# Altium footprint library Supernova Connectors.PcbLib: 303 footprints (part 2 of 19)
Each footprint in its own frame and in the unit in brackets; x right, y up, seen from the top. Pads: shape width x height; smd on the part's side, far side on the other; paste and mask are expansions set on the pad; w line width, h text height; cw(c..) or ccw(c..) is an arc to the next point about the centre after c.
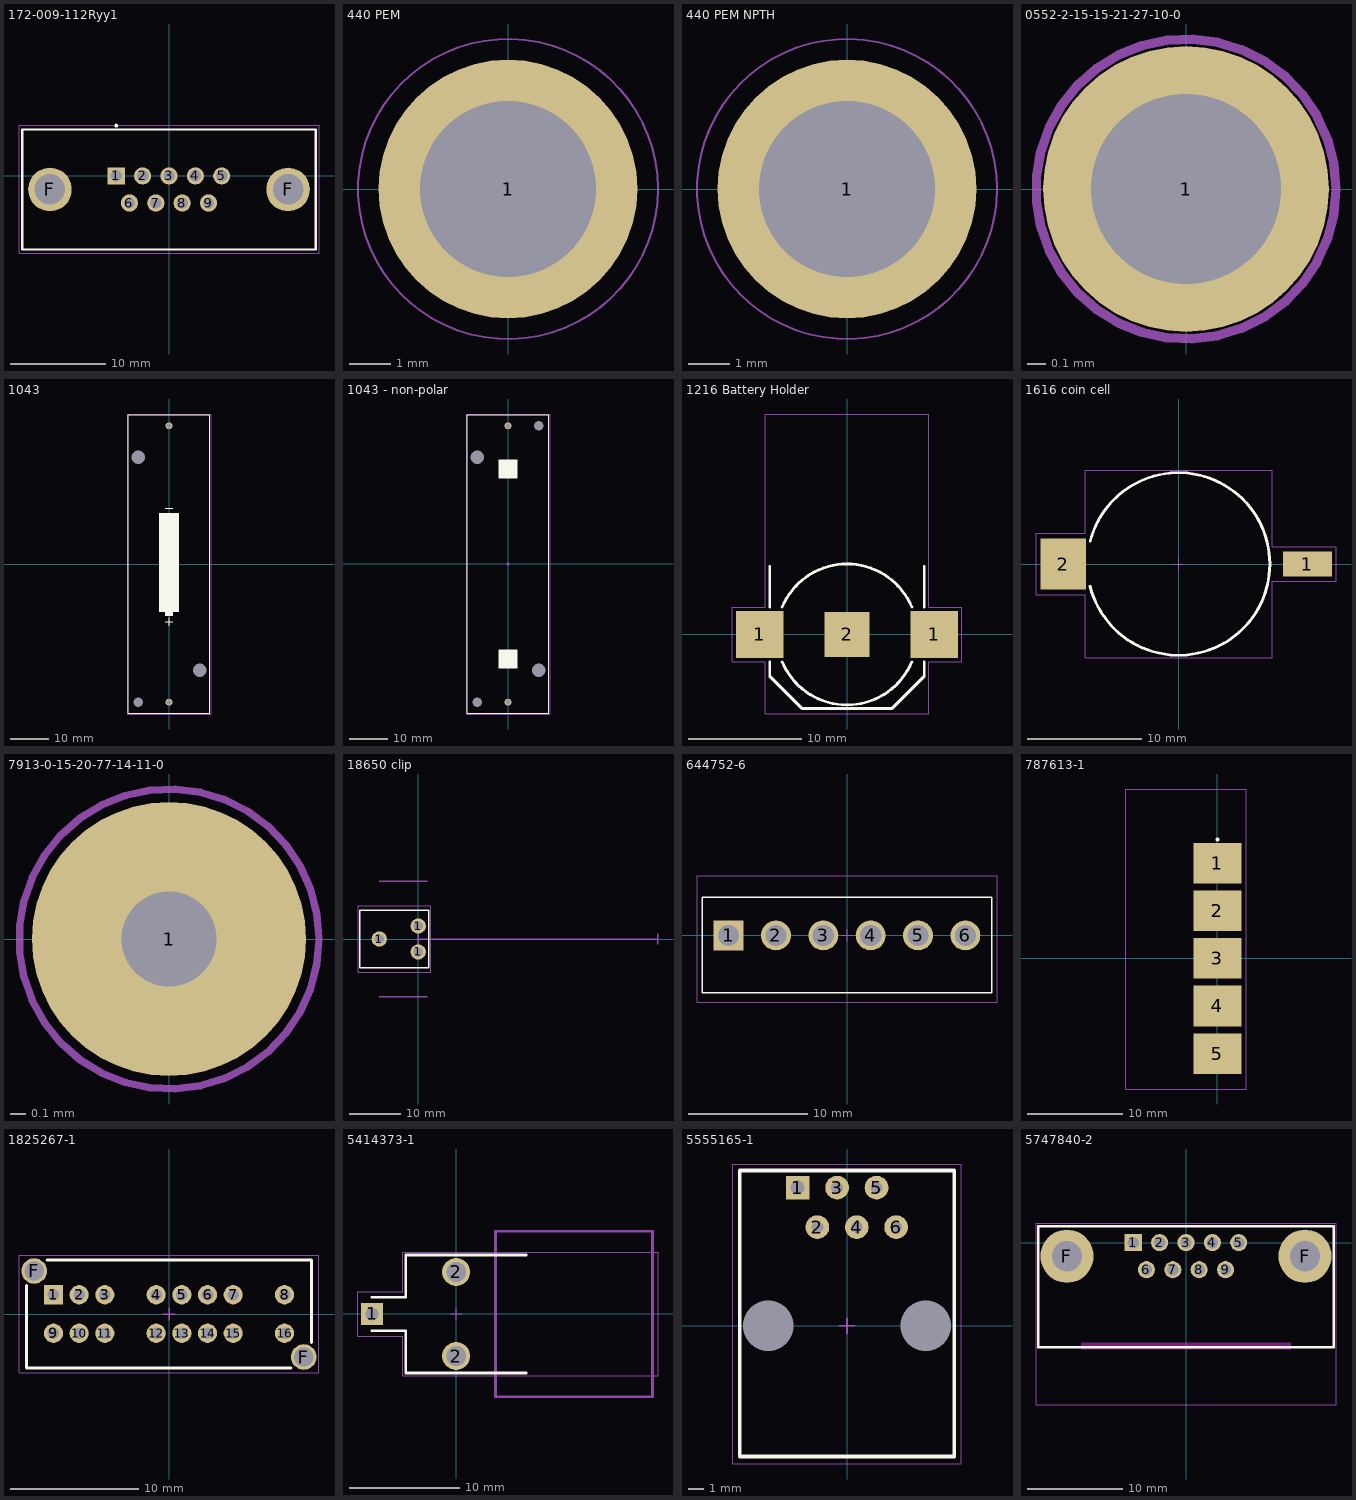
[diagram p1: the footprints below, top view; thin cyan lines are the x and y axes]

## 172-009-112Ryy1 [mil]
pads (11):
  rect 70.87x70.87 hole 47: 1(-218,0)
  round 70.87 hole 47: 2(-109,0) 3(0,0) 4(109,0) 5(218,0) 6(-163.5,-112) 7(-54.5,-112) 8(54.5,-112) 9(163.5,-112)
  round 180 hole 126: F(-492,-56) F(492,-56)
Top Overlay:
  circle w8: c-218,207.8 r4
  lines w10: -606.29,-304.13 606.7,-304.13 606.7,191.87 -606.29,191.87 -606.29,-304.13
Top Courtyard:
  lines w1.97: -620,-320 620,-320 620,210 -620,210 -620,-320
  lines w3.94: -19.68,0 19.68,0 ; 0,-19.69 0,19.68
3D body "172-009-112.STEP": height 494, standoff -189.5, extent -606.29,-304.13 606.7,191.87

## 440 PEM [mil]
pads (1):
  round 244 hole 166: 1(0,0)
Top Paste:
  region: 11.81,-113.56 21.51,-112.55 40.29,-107.27 57.9,-98.88 73.83,-87.63 87.63,-73.83 98.88,-57.9 107.27,-40.29 112.55,-21.51 113.56,-11.81 89,-11.81 89.21,-11.84 87.95,-19.08 83.68,-33.13 77.17,-46.3 68.62,-58.23 58.23,-68.62 46.3,-77.18 33.13,-83.68 19.08,-87.95 11.84,-89.22 11.81,-89
  region: 113.56,11.81 112.55,21.51 107.27,40.29 98.88,57.9 87.63,73.83 73.83,87.63 57.9,98.88 40.29,107.27 21.51,112.55 11.81,113.56 11.81,89 11.84,89.21 19.08,87.95 33.13,83.68 46.3,77.17 58.23,68.62 68.62,58.23 77.18,46.3 83.68,33.13 87.95,19.08 89.22,11.84 89,11.81
  region: -11.81,113.56 -21.51,112.55 -40.29,107.27 -57.9,98.88 -73.83,87.63 -87.63,73.83 -98.88,57.9 -107.27,40.29 -112.55,21.51 -113.56,11.81 -89,11.81 -89.21,11.84 -87.95,19.08 -83.68,33.13 -77.17,46.3 -68.62,58.23 -58.23,68.62 -46.3,77.18 -33.13,83.68 -19.08,87.95 -11.84,89.22 -11.81,89
  region: -113.56,-11.81 -112.55,-21.51 -107.27,-40.29 -98.88,-57.9 -87.63,-73.83 -73.83,-87.63 -57.9,-98.88 -40.29,-107.27 -21.51,-112.55 -11.81,-113.56 -11.81,-89 -11.84,-89.21 -19.08,-87.95 -33.13,-83.68 -46.3,-77.17 -58.23,-68.62 -68.62,-58.23 -77.18,-46.3 -83.68,-33.13 -87.95,-19.08 -89.22,-11.84 -89,-11.81
Top Courtyard:
  circle w1.97: c0,0 r141.42
  lines w3.94: -19.68,0 19.68,0 ; 0,-19.69 0,19.68
3D body "PEM.STEP": height 125, standoff -60, extent -109.49,-109.49 109.51,109.51

## 440 PEM NPTH [mil]
pads (1):
  round 244 / inner oval 78.74x244.02 / far side round 78.74 hole 166 unplated: 1(0,0)
Top Paste:
  region: 11.81,-113.56 21.51,-112.55 40.29,-107.27 57.9,-98.88 73.83,-87.63 87.63,-73.83 98.88,-57.9 107.27,-40.29 112.55,-21.51 113.56,-11.81 89,-11.81 89.21,-11.84 87.95,-19.08 83.68,-33.13 77.17,-46.3 68.62,-58.23 58.23,-68.62 46.3,-77.18 33.13,-83.68 19.08,-87.95 11.84,-89.22 11.81,-89
  region: 113.56,11.81 112.55,21.51 107.27,40.29 98.88,57.9 87.63,73.83 73.83,87.63 57.9,98.88 40.29,107.27 21.51,112.55 11.81,113.56 11.81,89 11.84,89.21 19.08,87.95 33.13,83.68 46.3,77.17 58.23,68.62 68.62,58.23 77.18,46.3 83.68,33.13 87.95,19.08 89.22,11.84 89,11.81
  region: -11.81,113.56 -21.51,112.55 -40.29,107.27 -57.9,98.88 -73.83,87.63 -87.63,73.83 -98.88,57.9 -107.27,40.29 -112.55,21.51 -113.56,11.81 -89,11.81 -89.21,11.84 -87.95,19.08 -83.68,33.13 -77.17,46.3 -68.62,58.23 -58.23,68.62 -46.3,77.18 -33.13,83.68 -19.08,87.95 -11.84,89.22 -11.81,89
  region: -113.56,-11.81 -112.55,-21.51 -107.27,-40.29 -98.88,-57.9 -87.63,-73.83 -73.83,-87.63 -57.9,-98.88 -40.29,-107.27 -21.51,-112.55 -11.81,-113.56 -11.81,-89 -11.84,-89.21 -19.08,-87.95 -33.13,-83.68 -46.3,-77.17 -58.23,-68.62 -68.62,-58.23 -77.18,-46.3 -83.68,-33.13 -87.95,-19.08 -89.22,-11.84 -89,-11.81
Top Courtyard:
  circle w1.97: c0,0 r141.42
  lines w3.94: -19.68,0 19.68,0 ; 0,-19.69 0,19.68
3D body "PEM.STEP": height 125, standoff -60, extent -109.49,-109.49 109.51,109.51

## 0552-2-15-15-21-27-10-0 [mil] "Pin socket"
pads (1):
  round 60 hole 40: 1(0,0)
Top Courtyard:
  circle w1.97: c0,0 r31.5
  lines w3.94: -19.68,0 19.68,0 ; 0,-19.69 0,19.68
3D body "mill-max-0552-2-15-15-21-XX-10-0.step": height 18, standoff -152, extent -27.49,-27.49 27.51,27.51

## 1043 [mil]
pads (5):
  round 70 hole 52: 1(0,-1411) 2(0,1411)
  round 39.37 hole 94 unplated: NC(-315,-1411)
  round 39.37 hole 136 unplated: NC(-315,1090) NC(315,-1085)
Top Overlay:
  rectangle: -40,-531 40,-491
  rectangle: -100,-491 100,520
  lines w10: -40,-591 40,-591 ; -40,569 40,569 ; 0,-631 0,-551 ; -417.32,-1523.62 -417.32,1523.62 417.32,1523.62 417.32,-1523.62 -417.32,-1523.62
Top Courtyard:
  lines w1.97: -425.2,-1531.5 425.2,-1531.5 425.2,1531.5 -425.2,1531.5 -425.2,-1531.5
  lines w3.94: -19.68,0 19.68,0 ; 0,-19.68 0,19.69
3D body "keystone-PN1043.STEP": height 587, standoff -140, extent -408,-1516 405,1517.63

## 1043 - non-polar [mil]
pads (6):
  round 70 hole 52: 1(0,-1411) 2(0,1411)
  round 39.37 hole 94 unplated: NC(-315,-1411) NC(315,1411)
  round 39.37 hole 136 unplated: NC(-315,1090) NC(315,-1085)
Top Overlay:
  rectangle: -98.43,871.48 98.43,1068.33
  region: 98.43,-871.48 -98.43,-871.48 -98.43,-1068.33 98.43,-1068.33
  lines w10: -417.32,-1523.62 417.32,-1523.62 417.32,1523.62 -417.32,1523.62 -417.32,-1523.62
Top Courtyard:
  lines w1.97: -425.2,-1531.5 -425.2,1531.5 425.2,1531.5 425.2,-1531.5 -425.2,-1531.5
  lines w3.94: -19.68,0 19.68,0 ; 0,-19.69 0,19.68
3D body "keystone-PN1043.STEP": height 587, standoff -140, extent -408,-1516 405,1517.63

## 1216 Battery Holder [mm]
pads (3):
  rect 4.17x4.17 smd paste-0.35: 1(-7.685,0) 1(7.685,0)
  rect 3.96x3.96 smd paste-5: 2(0,0)
Top Overlay:
  lines w0.254: -6.8,-2.423 -6.8,-3.675 -3.975,-6.5 3.95,-6.5 ; -6.8,2.4 -6.8,6 ; -5.707,-2.423 ccw(c0,0) 5.707,-2.423 ; -5.707,2.423 cw(c0,0) 5.707,2.423 ; 3.975,-6.5 6.8,-3.675 6.8,-2.423 ; 6.8,2.4 6.8,6
Top Courtyard:
  lines w0.05: -10.1,-2.4 -10.1,2.4 -7.2,2.4 -7.2,11.8 -7.2,19.4 7.2,19.4 7.2,2.4 10.1,2.4 10.1,-2.4 7.2,-2.4 7.2,-7 -7.2,-7 -7.2,-2.4 -10.1,-2.4
3D body "BK-885.STEP": height 3.17, standoff 0, extent -9.77,-6.375 9.77,6.325

## 1616 coin cell [mm]
pads (2):
  rect 4.3x2.2 smd paste-0.3: 1(11.3,0)
  rect 4x4.5 smd paste-0.4: 2(-10.1,0)
Top Overlay:
  lines w0.254: -7.76,-1.946 ccw(c0,0) 8,0 ccw(c0,0) -7.745,2.004
Top Courtyard:
  lines w0.05: -12.5,-2.7 -12.5,2.7 -8.2,2.7 -8.2,8.2 8.2,8.2 8.2,1.5 13.8,1.5 13.8,-1.5 8.2,-1.5 8.2,-8.2 -8.2,-8.2 -8.2,-2.7 -12.5,-2.7
  lines w0.1: -0.5,0 0.5,0 ; 0,-0.5 0,0.5
3D body: height 1.6, standoff 0, extent -8,-8 8,8

## 7913-0-15-20-77-14-11-0 [mil] "Pin socket"
pads (1):
  round 72 hole 25: 1(0,0)
Top Courtyard:
  circle w1.97: c0,0 r39.37
  lines w3.94: -19.68,0 19.68,0 ; 0,-19.69 0,19.68
3D body "mill-max-7913-0-15-20-77-14-11-0.step": height 288, standoff -125, extent -35.99,-35.99 36.01,36.01

## 18650 clip [mm]
pads (3):
  round 3 hole 1.83: 1(-7.62,0) 1(0,-2.54) 1(0,2.54)
Top Overlay:
  lines w0.254: -11.43,-5.588 -11.43,5.588 2.032,5.588 2.032,-5.588 -11.43,-5.588
Mechanical 5:
  lines w0.254: -7.62,-11.31 1.78,-11.31 ; -7.62,11.31 1.78,11.31 ; 0,-1 0,1 ; 0,0 47,0 ; 47,-1 47,1
Top Courtyard:
  lines w0.05: -11.8,-6.5 -11.8,6.5 2.5,6.5 2.5,-6.5 -11.8,-6.5
  lines w0.1: -0.5,0 0.5,0 ; 0,-0.5 0,0.5
3D body "keystone-PN54.STEP": height 18.3, standoff -3.05, extent -11.229,-9.051 1.778,9.051

## 644752-6 [mm]
pads (6):
  rect 2.5x2.5 hole 1.778: 1(-9.9,0)
  round 2.5 hole 1.778: 2(-5.94,0) 3(-1.98,0) 4(1.98,0) 5(5.94,0) 6(9.9,0)
Top Overlay:
  lines w0.127: -12.1,-4.8 -12.1,3.2 12.1,3.2 12.1,-4.8 -12.1,-4.8
Top Courtyard:
  lines w0.05: -12.54,-5.6 12.54,-5.6 12.54,5 -12.54,5 -12.54,-5.6
  lines w0.1: -0.5,0 0.5,0 ; 0,-0.5 0,0.5
3D body "c-644752-6-e-3d.stp": height 13.36, standoff -4.42, extent -11.9,-4.61 11.874,3.01

## 787613-1 [mil]
pads (5):
  rect 200x168 smd paste-15.75: 1(0,393.7) 2(0,196.85) 3(0,0) 4(0,-196.85) 5(0,-393.7)
Top Overlay:
  circle w8: c0,491.26 r4
Top Courtyard:
  lines w1.97: -380,-540 120,-540 120,700 -380,700 -380,-540
  lines w3.94: -19.68,0 19.68,0 ; 0,-19.68 0,19.69
3D body "c-787613-1-c-3d.stp": height 155.91, standoff -521.65, extent -367.77,-531.5 -21.31,688.98

## 1825267-1 [mm]
pads (18):
  rect 1.5x1.5 hole 0.9: 1(-9,1.5)
  round 1.5 hole 0.9: 2(-7,1.5) 3(-5,1.5) 4(-1,1.5) 5(1,1.5) 6(3,1.5) 7(5,1.5) 8(9,1.5) 9(-9,-1.5) 10(-7,-1.5) 11(-5,-1.5) 12(-1,-1.5) 13(1,-1.5) 14(3,-1.5) 15(5,-1.5) 16(9,-1.5)
  round 2 hole 1.5: F(-10.5,3.35) F(10.5,-3.35)
Top Overlay:
  lines w0.254: -11.1,2.2 -11.1,-4.2 9.5,-4.2 ; -9.5,4.2 11.1,4.2 11.1,-2.2
Top Courtyard:
  lines w0.05: -11.684,-4.572 11.684,-4.572 11.684,4.572 -11.684,4.572 -11.684,-4.572
  lines w0.1: -0.5,0 0.5,0 ; 0,-0.5 0,0.5
3D body "c-1825267-1-a-3d.stp": height 16.93, standoff -3.5, extent -11,-4.15 11,4.15

## 5414373-1 [mil] "BNC Connector"
pads (3):
  rect 80x80 hole 47: 1(-300,0)
  round 100 hole 70: 2(0,-150) 2(0,150)
Top Overlay:
  lines w10: -300,-60 -180,-60 -180,-210 250,-210 ; -300,60 -180,60 -180,210 250,210
Mechanical 5:
  lines w10: 140,-295.28 140,-210 140,210 140,295.28 700,295.28 700,-295.28 140,-295.28
Top Courtyard:
  lines w1.97: -350,-80 -350,80 -190,80 -190,220 720,220 720,-220 -190,-220 -190,-80 -350,-80
  lines w3.94: -19.68,0 19.68,0 ; 0,-19.69 0,19.68
3D body "c-5414373-1-a-3d.stp": height 367, standoff -110, extent -306,-190 700,190

## 5555165-1 [mil]
pads (8):
  rect 60x60 hole 35.43: 1(-124.8,350)
  round 60 hole 30: 2(-75,250) 3(-25,350) 4(24.8,250) 5(74.8,350) 6(124.61,250)
  round 118.11 hole 127.95 unplated: ""(-200,0) ""(200,0)
Top Overlay:
  lines w10: -271.65,-330.71 271.65,-330.71 271.65,-59.06 271.65,393.7 -271.65,393.7 -271.65,-59.06 -271.65,-330.71
Top Courtyard:
  lines w1.97: -290,-350 290,-350 290,410 -290,410 -290,-350
  lines w3.94: -19.68,0 19.68,0 ; 0,-19.69 0,19.68
3D body "c-5555165-1-e-3d.stp": height 497.5, standoff -147.5, extent -261.81,-323.5 261.19,386.5

## 5747840-2 [mil]
pads (11):
  rect 70.87x70.87 hole 47: 1(-218,0)
  round 70.87 hole 47: 2(-109,0) 3(0,0) 4(109,0) 5(218,0) 6(-163.5,-112) 7(-54.5,-112) 8(54.5,-112) 9(163.5,-112)
  round 220 hole 125: F(-492,-56) F(492,-56)
Top Layer keep-out:
  rectangle: -433.07,-440.94 433.07,-413.39
Top Overlay:
  lines w10: -611,-432.09 611,-432.09 611,67.91 -611,67.91 -611,-432.09
Top Courtyard:
  lines w1.97: -620,-670 620,-670 620,80 -620,80 -620,-670
  lines w3.94: -19.68,0 19.68,0 ; 0,-19.68 0,19.69
3D body "c-5747840-2-d-3d.stp": height 494, standoff -128.4, extent -611,-664.49 611,67.91